# Altium schematic symbol library LimeMicroAltiumLib.SchLib: 588 symbols (part 6 of 13)
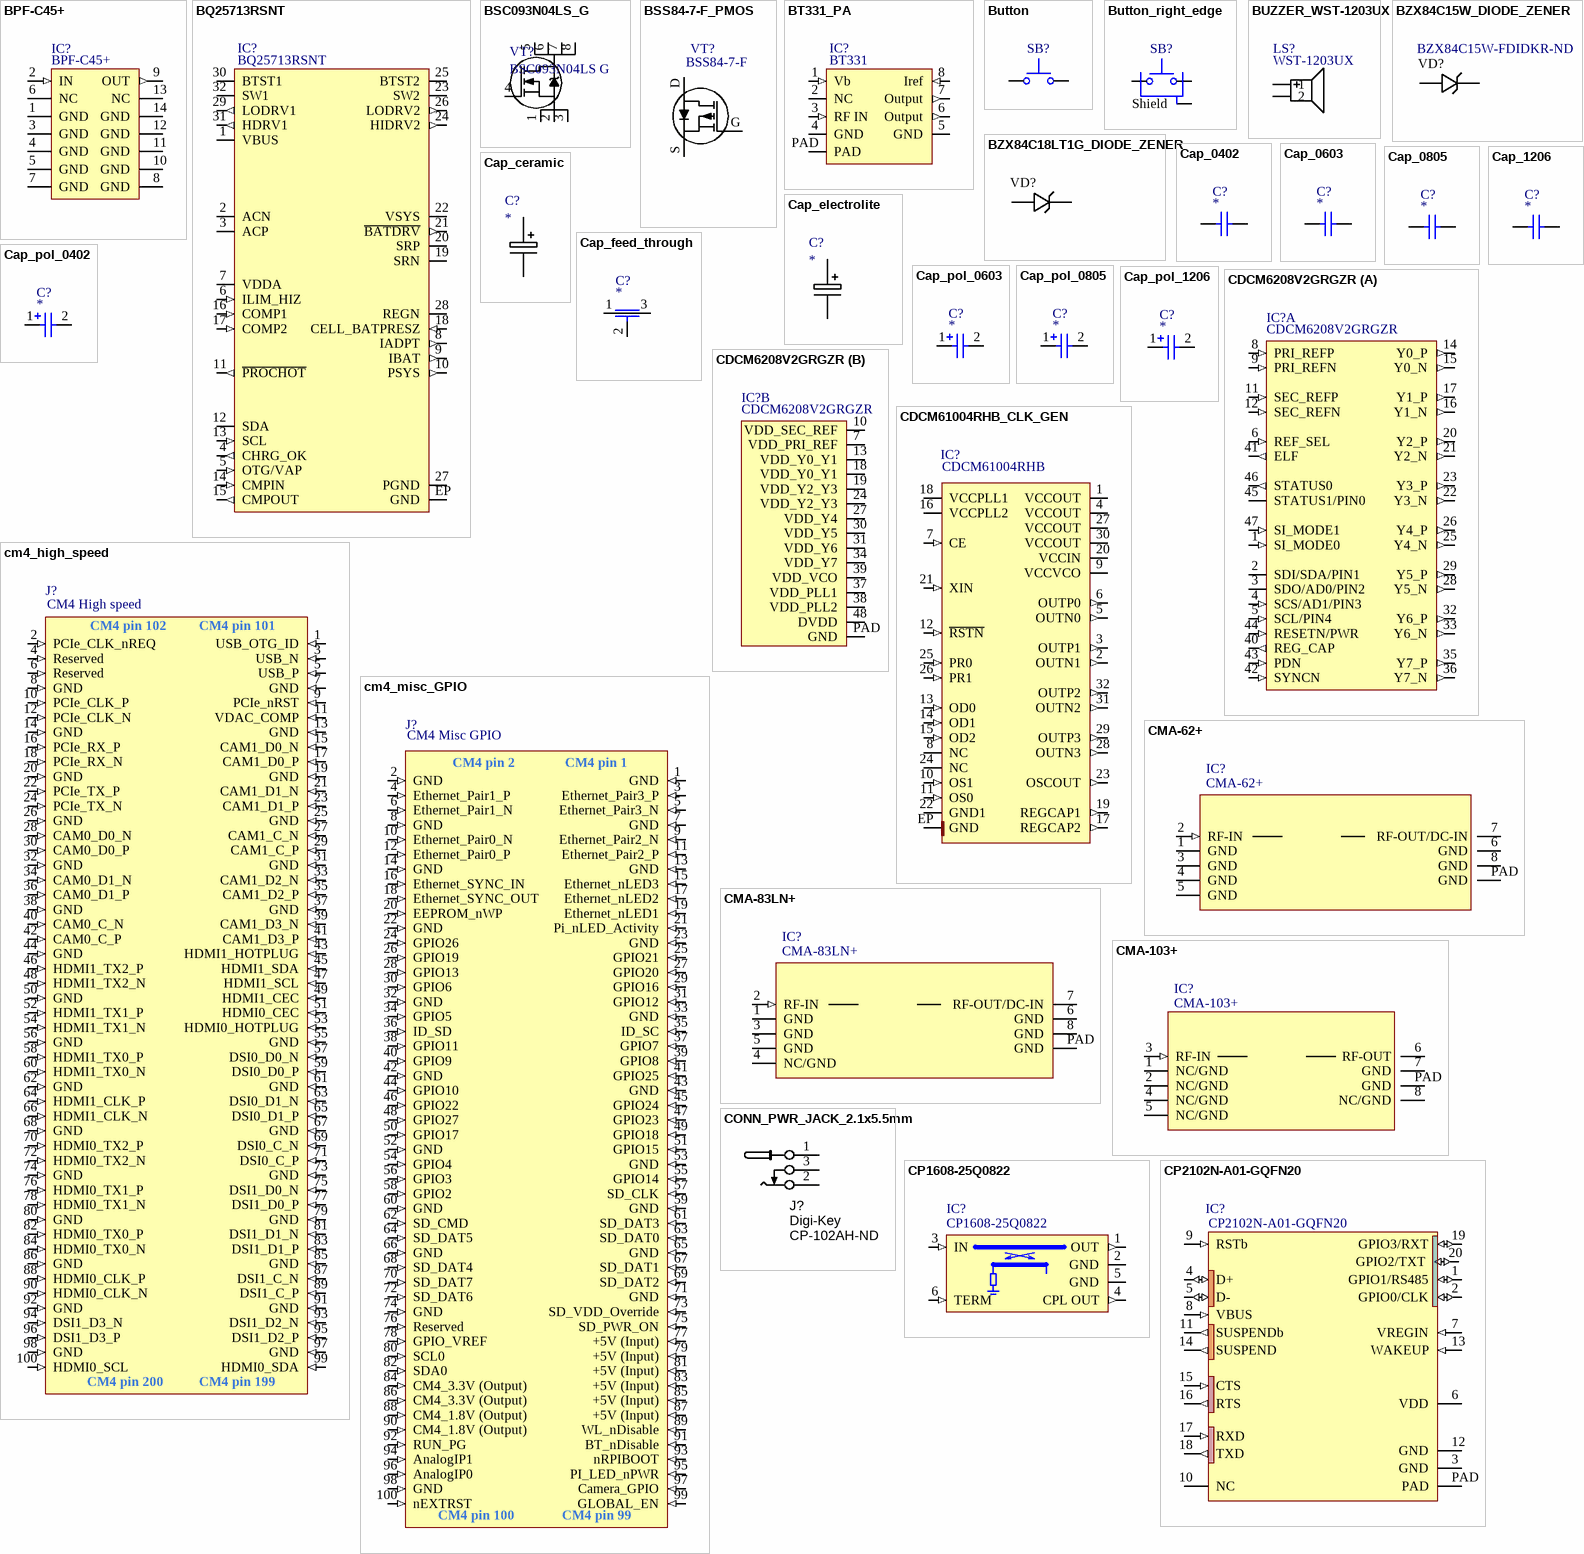
[diagram p79: symbols BPF-C45+ to CP2102N-A01-GQFN20]

## cm4_high_speed
designator J?, comment CM4 High speed
Manufacturer: Hirose; Manufacturer Part Number 1: DF40HC(3.0)-100DS-0.4V(51; Part Description: 100 Position Connector Receptacle, Center Strip Contacts Surface Mount Gold; Supplier 1: Mouser; Supplier Part Number 1: 798-DF40HC30100DS451; Stock 1: 0; Pricing 1: 1=2,50000, 10=2,15000, 50=2,15000, 100=2,00000, 250=1,75000, 500=1,70000, 1000=1,45000, 3000=1,34000, 10000=1,34000 (USD); RoHS: Yes; ComponentLink1URL: https://datasheet.ciiva.com/13559/ed-df40-20140305-13559540.pdf?src-supplier=Mouser; ComponentLink1Description: https://datasheet.ciiva.com/13559/ed-df40-20140305-13559540.pdf?src-supplier=Mouser; ComponentLink2URL: https://datasheet.ciiva.com/18562/ed-df40-20140305-18562462.pdf?src-supplier=Digi-Key; ComponentLink2Description: https://datasheet.ciiva.com/18562/ed-df40-20140305-18562462.pdf?src-supplier=Digi-Key
footprint FP-DF40HC_3_0_-100DS-0_4V-MFG
pins: 1 USB_OTG_ID (in), 2 PCIe_CLK_nREQ (in), 3 USB_N (in), 4 Reserved (in), 5 USB_P (in), 6 Reserved (in), 7 GND (in), 8 GND (in), 9 PCIe_nRST (in), 10 PCIe_CLK_P (in), 11 VDAC_COMP (in), 12 PCIe_CLK_N (in), 13 GND (in), 14 GND (in), 15 CAM1_D0_N (in), 16 PCIe_RX_P (in), 17 CAM1_D0_P (in), 18 PCIe_RX_N (in), 19 GND (in), 20 GND (in), 21 CAM1_D1_N (in), 22 PCIe_TX_P (in), 23 CAM1_D1_P (in), 24 PCIe_TX_N (in), 25 GND (in), 26 GND (in), 27 CAM1_C_N (in), 28 CAM0_D0_N (in), 29 CAM1_C_P (in), 30 CAM0_D0_P (in), 31 GND (in), 32 GND (in), 33 CAM1_D2_N (in), 34 CAM0_D1_N (in), 35 CAM1_D2_P (in), 36 CAM0_D1_P (in), 37 GND (in), 38 GND (in), 39 CAM1_D3_N (in), 40 CAM0_C_N (in), 41 CAM1_D3_P (in), 42 CAM0_C_P (in), 43 HDMI1_HOTPLUG (in), 44 GND (in), 45 HDMI1_SDA (in), 46 HDMI1_TX2_P (in), 47 HDMI1_SCL (in), 48 HDMI1_TX2_N (in), 49 HDMI1_CEC (in), 50 GND (in), 51 HDMI0_CEC (in), 52 HDMI1_TX1_P (in), 53 HDMI0_HOTPLUG (in), 54 HDMI1_TX1_N (in), 55 GND (in), 56 GND (in), 57 DSI0_D0_N (in), 58 HDMI1_TX0_P (in), 59 DSI0_D0_P (in), 60 HDMI1_TX0_N (in), 61 GND (in), 62 GND (in), 63 DSI0_D1_N (in), 64 HDMI1_CLK_P (in), 65 DSI0_D1_P (in), 66 HDMI1_CLK_N (in), 67 GND (in), 68 GND (in), 69 DSI0_C_N (in), 70 HDMI0_TX2_P (in), 71 DSI0_C_P (in), 72 HDMI0_TX2_N (in), 73 GND (in), 74 GND (in), 75 DSI1_D0_N (in), 76 HDMI0_TX1_P (in), 77 DSI1_D0_P (in), 78 HDMI0_TX1_N (in), 79 GND (in), 80 GND (in), 81 DSI1_D1_N (in), 82 HDMI0_TX0_P (in), 83 DSI1_D1_P (in), 84 HDMI0_TX0_N (in), 85 GND (in), 86 GND (in), 87 DSI1_C_N (in), 88 HDMI0_CLK_P (in), 89 DSI1_C_P (in), 90 HDMI0_CLK_N (in), 91 GND (in), 92 GND (in), 93 DSI1_D2_N (in), 94 DSI1_D3_N (in), 95 DSI1_D2_P (in), 96 DSI1_D3_P (in), 97 GND (in), 98 GND (in), 99 HDMI0_SDA (in), 100 HDMI0_SCL (in)
text: CM4 pin 102; CM4 pin 101; CM4 pin 200; CM4 pin 199

## cm4_misc_GPIO
designator J?, comment CM4 Misc GPIO
Manufacturer: Hirose; Manufacturer Part Number 1: DF40HC(3.0)-100DS-0.4V(51; Part Description: 100 Position Connector Receptacle, Center Strip Contacts Surface Mount Gold; Supplier 1: Mouser; Supplier Part Number 1: 798-DF40HC30100DS451; Stock 1: 0; Pricing 1: 1=2,50000, 10=2,15000, 50=2,15000, 100=2,00000, 250=1,75000, 500=1,70000, 1000=1,45000, 3000=1,34000, 10000=1,34000 (USD); RoHS: Yes; ComponentLink1URL: https://datasheet.ciiva.com/13559/ed-df40-20140305-13559540.pdf?src-supplier=Mouser; ComponentLink1Description: https://datasheet.ciiva.com/13559/ed-df40-20140305-13559540.pdf?src-supplier=Mouser; ComponentLink2URL: https://datasheet.ciiva.com/18562/ed-df40-20140305-18562462.pdf?src-supplier=Digi-Key; ComponentLink2Description: https://datasheet.ciiva.com/18562/ed-df40-20140305-18562462.pdf?src-supplier=Digi-Key
footprint FP-DF40HC_3_0_-100DS-0_4V-MFG
pins: 1 GND (in), 2 GND (in), 3 Ethernet_Pair3_P (in), 4 Ethernet_Pair1_P (in), 5 Ethernet_Pair3_N (in), 6 Ethernet_Pair1_N (in), 7 GND (in), 8 GND (in), 9 Ethernet_Pair2_N (in), 10 Ethernet_Pair0_N (in), 11 Ethernet_Pair2_P (in), 12 Ethernet_Pair0_P (in), 13 GND (in), 14 GND (in), 15 Ethernet_nLED3 (in), 16 Ethernet_SYNC_IN (in), 17 Ethernet_nLED2 (in), 18 Ethernet_SYNC_OUT (in), 19 Ethernet_nLED1 (in), 20 EEPROM_nWP (in), 21 Pi_nLED_Activity (in), 22 GND (in), 23 GND (in), 24 GPIO26 (in), 25 GPIO21 (in), 26 GPIO19 (in), 27 GPIO20 (in), 28 GPIO13 (in), 29 GPIO16 (in), 30 GPIO6 (in), 31 GPIO12 (in), 32 GND (in), 33 GND (in), 34 GPIO5 (in), 35 ID_SC (in), 36 ID_SD (in), 37 GPIO7 (in), 38 GPIO11 (in), 39 GPIO8 (in), 40 GPIO9 (in), 41 GPIO25 (in), 42 GND (in), 43 GND (in), 44 GPIO10 (in), 45 GPIO24 (in), 46 GPIO22 (in), 47 GPIO23 (in), 48 GPIO27 (in), 49 GPIO18 (in), 50 GPIO17 (in), 51 GPIO15 (in), 52 GND (in), 53 GND (in), 54 GPIO4 (in), 55 GPIO14 (in), 56 GPIO3 (in), 57 SD_CLK (in), 58 GPIO2 (in), 59 GND (in), 60 GND (in), 61 SD_DAT3 (in), 62 SD_CMD (in), 63 SD_DAT0 (in), 64 SD_DAT5 (in), 65 GND (in), 66 GND (in), 67 SD_DAT1 (in), 68 SD_DAT4 (in), 69 SD_DAT2 (in), 70 SD_DAT7 (in), 71 GND (in), 72 SD_DAT6 (in), 73 SD_VDD_Override (in), 74 GND (in), 75 SD_PWR_ON (in), 76 Reserved (in), 77 +5V (Input) (in), 78 GPIO_VREF (in), 79 +5V (Input) (in), 80 SCL0 (in), 81 +5V (Input) (in), 82 SDA0 (in), 83 +5V (Input) (in), 84 CM4_3.3V (Output) (in), 85 +5V (Input) (in), 86 CM4_3.3V (Output) (in), 87 +5V (Input) (in), 88 CM4_1.8V (Output) (in), 89 WL_nDisable (in), 90 CM4_1.8V (Output) (in), 91 BT_nDisable (in), 92 RUN_PG (in), 93 nRPIBOOT (in), 94 AnalogIP1 (in), 95 PI_LED_nPWR (in), 96 AnalogIP0 (in), 97 Camera_GPIO (in), 98 GND (in), 99 GLOBAL_EN (in), 100 nEXTRST (in)
text: CM4 pin 2; CM4 pin 1; CM4 pin 100; CM4 pin 99

## CMA-62+
designator IC?
Monolithic Amplifier 50Ω 0.01 to 6 GHz; Manufacturer: Mini-Circuits; Part Description: Monolithic Amplifier 50Ω 0.01 to 6 GHz; Manufacturer Part Number 1: CMA-62+; Supplier 1: Mini-Circuits; Supplier Part Number 1: CMA-62+
footprint CMA-62+_DL1721 (Quad Flat No Lead, Plastic; 16 Terminals; Body 3 x 3 mm; Pitch 0.5 mm)
pins: 1 GND, 2 RF-IN (in), 3 GND, 4 GND, 5 GND, 6 GND, 7 RF-OUT/DC-IN (oc), 8 GND, PAD GND

## CMA-83LN+
designator IC?
Monolithic Amplifier 50Ω 0.5 to 8 GHz; Manufacturer: Mini-Circuits; Part Description: Monolithic Amplifier 50Ω 0.5 to 8 GHz; Manufacturer Part Number 1: CMA-83LN+; Supplier 1: Mini-Circuits; Supplier Part Number 1: CMA-83LN+
footprint CMA-62+_DL1721 (Quad Flat No Lead, Plastic; 16 Terminals; Body 3 x 3 mm; Pitch 0.5 mm)
pins: 1 GND, 2 RF-IN (in), 3 GND, 4 NC/GND, 5 GND, 6 GND, 7 RF-OUT/DC-IN (oc), 8 GND, PAD GND

## CMA-103+
designator IC?
Monolithic Amplifier 50Ω 0.05 to 4 GHz; Manufacturer: Mini-Circuits; Manufacturer Part Number 1: CMA-103+; Part Description: Monolithic Amplifier 50Ω 0.05 to 4 GHz; Supplier 1: Mini-Circuits; Supplier Part Number 1: CMA-103+
footprint CMA-103+_DL1721 (Quad Flat No Lead, Plastic; 16 Terminals; Body 3 x 3 mm; Pitch 0.5 mm)
pins: 1 NC/GND, 2 NC/GND, 3 RF-IN (in), 4 NC/GND, 5 NC/GND, 6 RF-OUT (oc), 7 GND, 8 NC/GND, PAD GND

## CONN_PWR_JACK_2.1x5.5mm
designator J?  Supplier 1: Digi-Key  Supplier Part Number 1: CP-102AH-ND  (hidden comment: *)
Power Connector, THT, 2.1mm ID, 5.5mm OD; Manufacturer 1: CUI Inc; Manufacturer Part Number 1: PJ-102AH; Category: Connectors; Mounting Type: Through Hole; Package / Case: PCB mount; Value: 2.1mm ID, 5.5mm OD
footprint CONN_PWR_JACK_2.1x5.5mm (Power Connector, 2.1mm ID, 5.5mm OD)
pins: 1, 2, 3

## CP1608-25Q0822
designator IC?
RF coupler; Part Description: 0.8 ~ 6 GHz monolithic coupler, 1608 package; Manufacturer: ACX; Supplier 1: ACX; Manufacturer Part Number 1: CP1608-25Q0822; Supplier Part Number 1: CP1608-25Q0822
footprint CP1608-25Q0822T
pins: 1 OUT (out), 2 GND, 3 IN (in), 4 CPL OUT (out), 5 GND, 6 TERM (in)

## CP2102N-A01-GQFN20
designator IC?
Part Description: USB Bridge, USB to UART USB 2.0 UART Interface 24-QFN (4x4); Manufacturer: Silicon Labs; Protocol: USB; Function: Bridge, USB to UART; Interface: UART; Standards: USB 2.0; Voltage - Supply: 2.2 V ~ 3.6 V; Current - Supply: 9.5mA; Supplier 1: Digi-Key; Manufacturer Part Number 1: CP2102N-A01-GQFN20; RoHS: RoHS Compliant; Category: Integrated Circuits (ICs); Stock 1: 19; Pricing 1: 1=1.34, 25=1.2928, 100=1.2423, 1000=1.1716 (USD); Packaging: Tray; Part Status: Active; Operating Temperature: -40°C ~ 85°C; Package / Case: 20-WFQFN Exposed Pad; Supplier Device Package: 20-QFN (3x3); ComponentLink1URL: http://www.silabs.com/support%20documents/technicaldocs/cp2102n-datasheet.pdf; ComponentLink1Description: http://www.silabs.com/support%20documents/technicaldocs/cp2102n-datasheet.pdf; Supplier Part Number 1: 336-3692-ND
footprint CP2102N-A01-GQFN20 (Footprint not found)
pins: 1 GPIO1/RS485 (io), 2 GPIO0/CLK (io), 3 GND, 4 D+ (io), 5 D- (io), 6 VDD (power), 7 VREGIN (in), 8 VBUS (in), 9 RSTb (in), 10 NC, 11 SUSPENDb (out), 12 GND, 13 WAKEUP (in), 14 SUSPEND (out), 15 CTS (in), 16 RTS (out), 17 RXD (in), 18 TXD (out), 19 GPIO3/RXT (io), 20 GPIO2/TXT (io), PAD

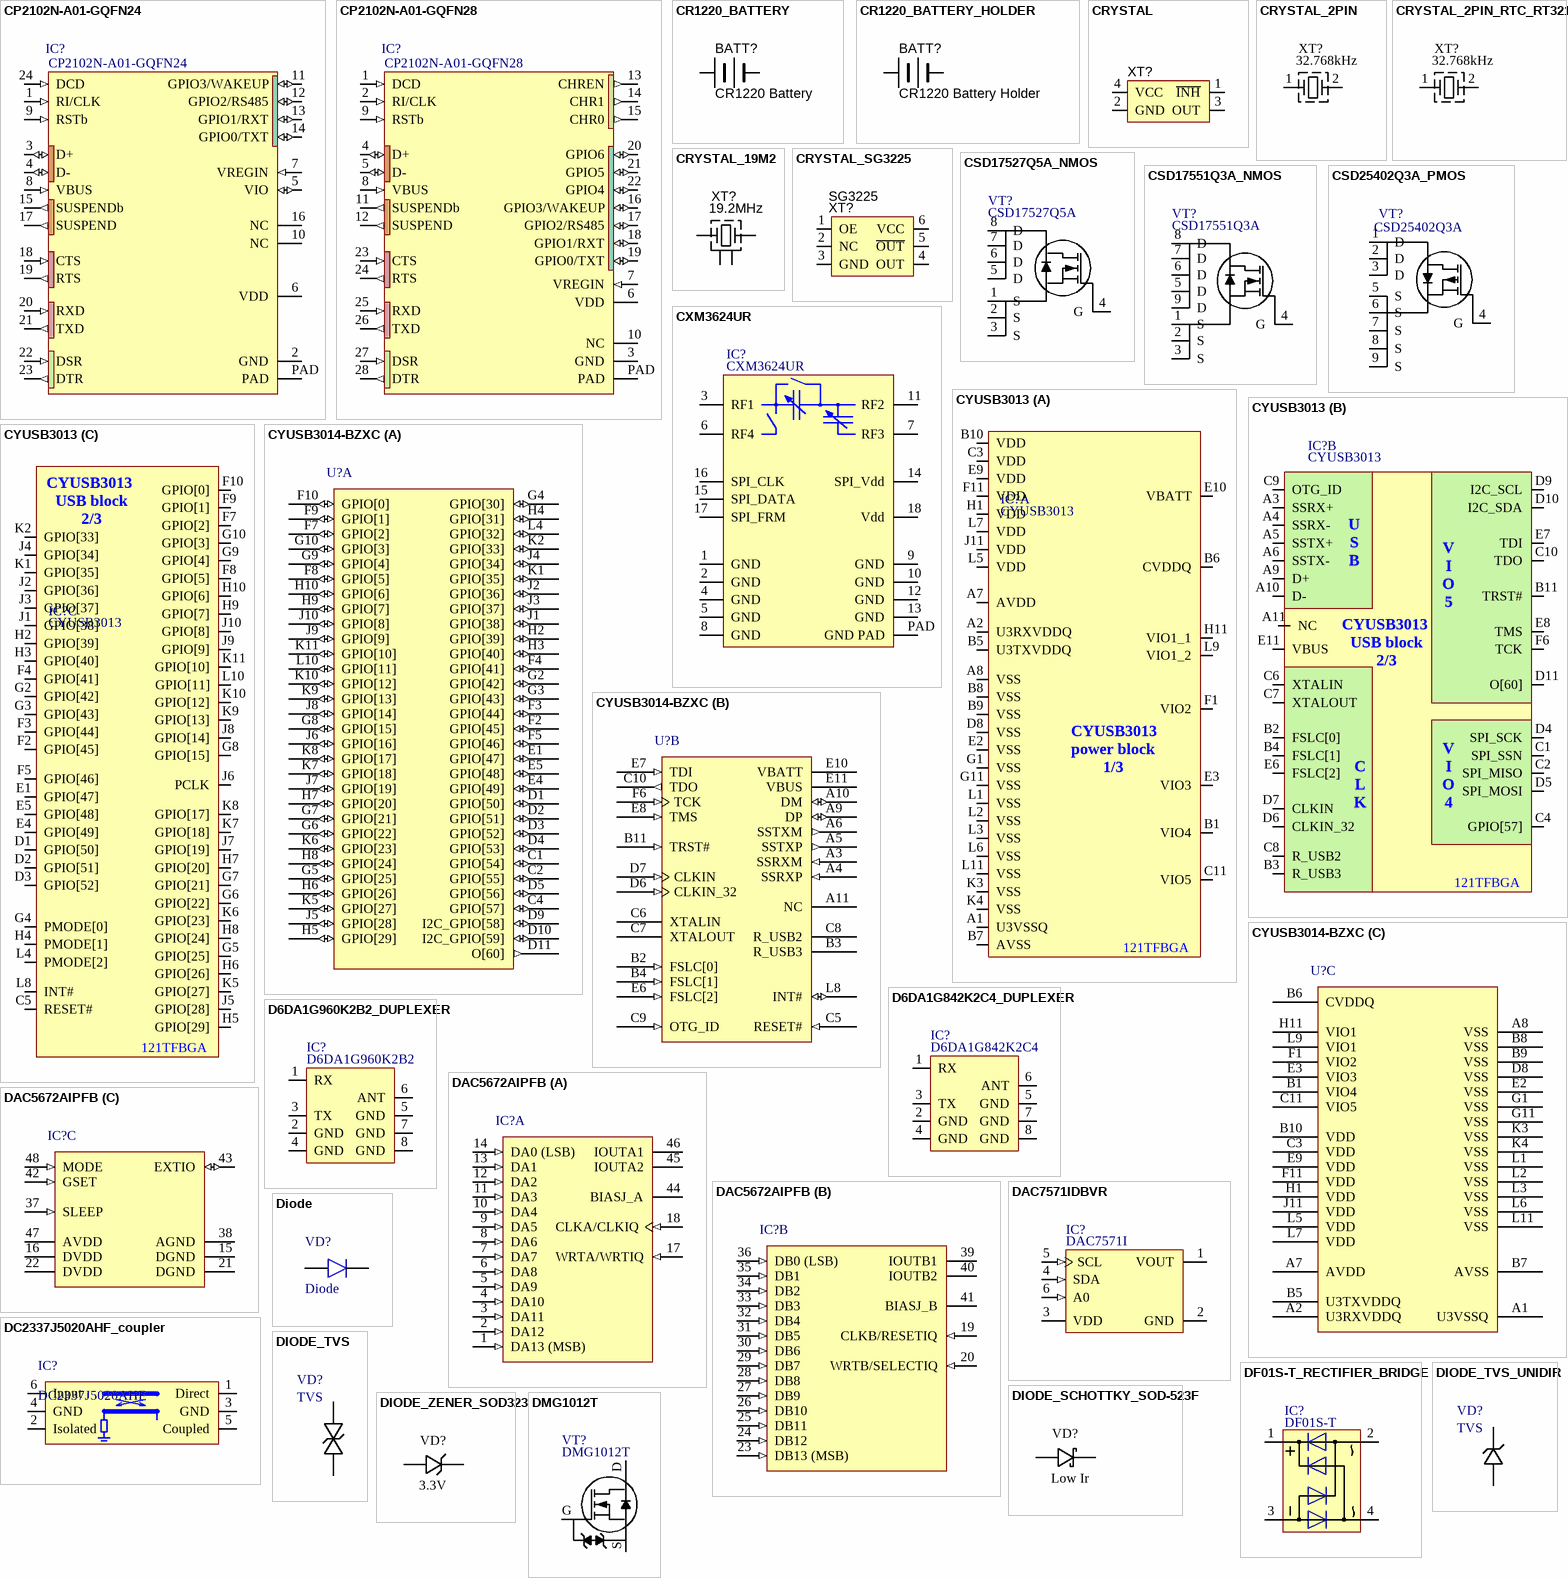
[diagram p25: symbols CP2102N-A01-GQFN24 to DMG1012T]

## CP2102N-A01-GQFN24
designator IC?
Part Description: USB Bridge, USB to UART USB 2.0 UART Interface 24-QFN (4x4); Manufacturer: Silicon Labs; Protocol: USB; Function: Bridge, USB to UART; Interface: UART; Standards: USB 2.0; Voltage - Supply: 2.2 V ~ 3.6 V; Current - Supply: 9.5mA; Supplier 1: Digi-Key; Manufacturer Part Number: CP2102N-A01-GQFN24; RoHS: RoHS Compliant; Category: Integrated Circuits (ICs); Stock 1: 608; Pricing 1: 1=1.36, 25=1.3132, 100=1.2625, 1000=1.2019 (USD); Packaging: Tray; Part Status: Active; Operating Temperature: -40°C ~ 85°C; Package / Case: 24-VFQFN Exposed Pad; Supplier Device Package: 24-QFN (4x4); ComponentLink1URL: http://www.silabs.com/support%20documents/technicaldocs/cp2102n-datasheet.pdf; ComponentLink1Description: http://www.silabs.com/support%20documents/technicaldocs/cp2102n-datasheet.pdf; Supplier Part Number 1: 336-3693-ND
footprint CP2102N-A01-GQFN24 (Footprint not found)
pins: 1 RI/CLK (in), 2 GND, 3 D+ (io), 4 D- (io), 5 VIO (io), 6 VDD (power), 7 VREGIN (in), 8 VBUS (in), 9 RSTb (in), 10 NC, 11 GPIO3/WAKEUP (io), 12 GPIO2/RS485 (io), 13 GPIO1/RXT (io), 14 GPIO0/TXT (io), 15 SUSPENDb (out), 16 NC, 17 SUSPEND (out), 18 CTS (in), 19 RTS (out), 20 RXD (in), 21 TXD (out), 22 DSR (in), 23 DTR (out), 24 DCD (in), PAD

## CP2102N-A01-GQFN28
designator IC?
Manufacturer: Silicon Labs; Part Description: USB Bridge, USB to UART USB 2.0 UART Interface 28-QFN (5x5); Protocol: USB; Function: Bridge, USB to UART; Interface: UART; Standards: USB 2.0; Voltage - Supply: 2.2 V ~ 3.6 V; Current - Supply: 9.5mA; Supplier 1: Digi-Key; Manufacturer Part Number 1: CP2102N-A01-GQFN28; RoHS: RoHS Compliant; Category: Integrated Circuits (ICs); Stock 1: 262; Pricing 1: 1=1.41, 25=1.3636, 100=1.313, 1000=1.2524 (USD); Packaging: Tray; Part Status: Active; Operating Temperature: -40°C ~ 85°C; Package / Case: 28-WFQFN Exposed Pad; Supplier Device Package: 28-QFN (5x5); ComponentLink1URL: http://www.silabs.com/support%20documents/technicaldocs/cp2102n-datasheet.pdf; ComponentLink1Description: http://www.silabs.com/support%20documents/technicaldocs/cp2102n-datasheet.pdf; Supplier Part Number 1: 336-3694-ND
footprint CP2102N-A01-GQFN28 (Footprint not found)
pins: 1 DCD (in), 2 RI/CLK (in), 3 GND, 4 D+ (io), 5 D- (io), 6 VDD (power), 7 VREGIN (in), 8 VBUS (in), 9 RSTb (in), 10 NC, 11 SUSPENDb (out), 12 SUSPEND (out), 13 CHREN (out), 14 CHR1 (out), 15 CHR0 (out), 16 GPIO3/WAKEUP (io), 17 GPIO2/RS485 (io), 18 GPIO1/RXT (io), 19 GPIO0/TXT (io), 20 GPIO6 (io), 21 GPIO5 (io), 22 GPIO4 (io), 23 CTS (in), 24 RTS (out), 25 RXD (in), 26 TXD (out), 27 DSR (in), 28 DTR (out), PAD

## CR1220_BATTERY
designator BATT?, comment CR1220 Battery  (mechanical)
Part Description: Lithium Battery Non-Rechargeable (Primary) 3V Coin, 12.5mm; Manufacturer: Panasonic - BSG; Battery Chemistry: Lithium; Battery Cell Size: Coin, 12.5mm; Voltage - Rated: 3V; Capacity: 35mAh; Discharge Rate: 100µA; Shipping Info: Due to possible restrictions, a change in ship method may be required.; Max Air Shipment Qty: 1600; Supplier 1: Digi-Key; Manufacturer Part Number 1: CR1220; RoHS: Not Applicable; Category: Battery Products; Stock 1: 19831; Pricing 1: 1=0.9, 10=0.812, 50=0.7214, 100=0.6312, 250=0.57712, 500=0.54106, 1600=0.48153, 3200=0.44651, 5000=0.43775 (USD); Part Status: Active; Size / Dimension: 0.49" Dia x 0.08" H (12.5mm x 2.0mm); Termination Style: Requires Holder; Weight: 1.2g; ComponentLink1URL: http://na.industrial.panasonic.com/sites/default/pidsa/files/crseries_datasheets_merged.pdf; ComponentLink1Description: http://na.industrial.panasonic.com/sites/default/pidsa/files/crseries_datasheets_merged.pdf; Supplier Part Number 1: P033-ND
pins: NEGATIVE, POSITIVE

## CR1220_BATTERY_HOLDER
designator BATT?, comment CR1220 Battery Holder
Part Description: HOLDER COIN CELL FOR CR1220 SMD; Manufacturer: MPD (Memory Protection Devices); Manufacturer Part Number 1: BC501SM; Battery Type, Function: Coin Cell, Holder; Style: Holder (Open); Battery Cell Size: Coin, 12.0mm; Number of Cells: 1; Battery Series: 1220; Supplier 1: Digi-Key; RoHS: RoHS Compliant; Category: Battery Products; Stock 1: 17830; Pricing 1: 1=0.88, 10=0.81, 100=0.73, 500=0.68, 1000=0.59 (USD); Part Status: Active; Mounting Type: PCB, Surface Mount; Termination Style: SMD (SMT) Tab; Height Above Board: 0.157" (4.00mm); Operating Temperature: -40°C ~ 85°C; ComponentLink1URL: http://www.memoryprotectiondevices.com/datasheets/BC501SM-datasheet.pdf; ComponentLink1Description: http://www.memoryprotectiondevices.com/datasheets/BC501SM-datasheet.pdf; Supplier Part Number 1: BC501SM-ND
footprint CR1220_SMD_holder
pins: NEGATIVE, POSITIVE

## CRYSTAL
designator XT?
Oscillator Crystal
footprint CRYSTAL_4-LCC_v3 (SMD Crystal 4-lead leadless package)
pins: 1 ~{INH}, 2 GND, 3 OUT, 4 VCC

## CRYSTAL_2PIN
designator XT?, comment 32.768kHz
Manufacturer 1: EPSON; Manufacturer Part Number 1: FC-135R 32.7680KA-A3; Part Description: 32.768kHz ±20ppm Crystal 12.5pF 50 kOhms 2-SMD, No Lead; Supplier 1: Digi-Key; Supplier Part Number 1: SER4071CT-ND
footprint CRYSTAL_RTC_2PIN_3P2x1P5
pins: 1 X, 2 X

## CRYSTAL_2PIN_RTC_RT3215
designator XT?, comment 32.768kHz
Part Description: 32.768 kHz ±10ppm Crystal 12.5pF 70 kOhms 2-SMD, No Lead; Manufacturer: Raltron Electronics; Manufacturer Part Number 1: RT3215-32.768-12.5-TR-10PPM; Supplier 1: Digi-Key; Supplier Part Number 1: 2151-RT3215-32.768-12.5-TR-10PPMTR-ND; Stock 1: 21000; Pricing 1: 3000=0,39875, 6000=0,38500, 15000=0,37125 (USD); Lead Free: Lead Free; RoHS Compliant: Yes; ComponentLink1URL: https://datasheet.octopart.com/RT3215-32.768-12.5-TR-10PPM-Raltron-Electronics-datasheet-12522443.pdf?src-supplier=Future+Electronics; ComponentLink1Description: https://datasheet.octopart.com/RT3215-32.768-12.5-TR-10PPM-Raltron-Electronics-datasheet-12522443.pdf?src-supplier=Future+Electronics; ComponentLink2URL: https://datasheet.octopart.com/RT3215-32.768-12.5-TR-10PPM-Raltron-Electronics-datasheet-62112304.pdf?src-supplier=Future+Electronics; ComponentLink2Description: https://datasheet.octopart.com/RT3215-32.768-12.5-TR-10PPM-Raltron-Electronics-datasheet-62112304.pdf?src-supplier=Future+Electronics; ComponentLink3URL: https://datasheet.octopart.com/RT3215-32.768-12.5-TR-10PPM-Raltron-Electronics-datasheet-82614827.pdf?src-supplier=Future+Electronics; ComponentLink3Description: https://datasheet.octopart.com/RT3215-32.768-12.5-TR-10PPM-Raltron-Electronics-datasheet-82614827.pdf?src-supplier=Future+Electronics
footprint CRYSTAL_2PIN_RTC_RT3215
pins: 1 X, 2 X

## CRYSTAL_19M2
designator XT?, comment 19.2MHz
Oscillator Crystal 27.12 MHz 10ppm; Manufacturer 1: TXC CORPORATION; Manufacturer Part Number 1: 7M-27.120MEEQ-T; Ratings: 4.9152 MHz Crystal; Load Capacitance: 10pF; Operating Mode: Fundamental; Package / Case: 2.5mm pitch; Material: Ceramic; Supplier 1: Digi-Key; Supplier Part Number 1: 887-1329-1-ND; Type: MHz Crystal; Frequency Stability: ±10ppm; Frequency Tolerance: ±10ppm; Operating Temperature: -20°C ~ 70°C; Mounting Type: Surface Mount; Size / Dimension: 0.126" L x 0.098" W (3.20mm x 2.50mm); ComponentLink1URL: http://www.txccrystal.com/images/pdf/7m-accuracy.pdf; ComponentLink1Description: http://www.txccrystal.com/images/pdf/7m-accuracy.pdf
footprint CRYSTAL_4-LCC (SMD Crystal 4-lead leadless package)
pins: 1 X, 2 GND, 3 X, 4 GND

## CRYSTAL_SG3225
designator XT?, comment SG3225
Oscillator Crystal; Manufacturer Part Number 1: SG3225EAN 100.000000M-KEGA3; Manufacturer: EPSON; Voltage - Supply: 2.5 V ~ 3.3 V; Output: LVPECL; Function: Tri-State (Output Enable); Frequency Stability: ±30ppm; Frequency: 100MHz; Current - Supply (Max): 65mA; Current - Supply (Disable) (Max): 20mA; Supplier 1: Digi-Key; Category: Crystals and Oscillators; Packaging: Cut Tape (CT); Type: XO (Standard); RoHS: RoHS Compliant; Package / Case: 6-SMD, No Lead (DFN, LCC); Height: 0.047" (1.20mm); Mounting Type: Surface Mount; Ratings: -; Operating Temperature: -40°C ~ 85°C; Size / Dimension: 0.126" L x 0.098" W (3.20mm x 2.50mm); Supplier Part Number 1: SER3921CT-ND
footprint CRYSTAL_6-LCC (SMD Crystal 6-lead leadless package)
pins: 1 OE, 2 NC, 3 GND, 4 OUT, 5 ~{OUT}, 6 VCC (power)

## CSD17527Q5A_NMOS
designator VT?, comment CSD17527Q5A
Part Desription: N-Channel 30V 65A (Tc) 3W (Ta) Surface Mount 8-VSONP (5x6); Manufacturer: Texas Instruments; Rise Time: 8.2ns; Rds On Max: 10.8mR; Input Capacitance: 506pF; Drain to Source Voltage (Vdss): 30V; Continuous Drain Current (ID): 65A; Max Power Dissipation: 3W; Fall Time: 3.2ns; Gate to Source Voltage (Vgs): 20V; Turn-Off Delay Time: 9.8ns; Turn-On Delay Time: 5.6ns; Number of Elements: 1; Element Configuration: Single; ComponentLink1URL: http://www.st.com/web/en/resource/technical/document/datasheet/CD00103832.pdf; ComponentLink1Description: http://www.st.com/web/en/resource/technical/document/datasheet/CD00103832.pdf; ComponentLink2URL: http://www.st.com/content/ccc/resource/technical/document/datasheet/00/75/48/c3/62/90/4a/32/CD00103832.pdf/files/CD00103832.pdf/jcr:content/translations/en.CD00103832.pdf; ComponentLink2Description: http://www.st.com/content/ccc/resource/technical/document/datasheet/00/75/48/c3/62/90/4a/32/CD00103832.pdf/files/CD00103832.pdf/jcr:content/translations/en.CD00103832.pdf; ComponentLink3URL: http://www.mouser.com/ds/2/389/CD00103832-114014.pdf; ComponentLink3Description: http://www.mouser.com/ds/2/389/CD00103832-114014.pdf; Supplier 1: Digi-Key; Manufacturer Part Number 1: CSD17527Q5A; RoHS: Yes; Stock 1: 28951; Pricing 1: 1 = 1,20000, 10 = 1,06600, 100 = 0,84280, 500 = 0,65364, 1000 = 0,51603 (USD); Mount: Surface Mount; Number of Pins: 8; Contact Plating: Tin; Min Operating Temperature: -55°C; Max Operating Temperature: 150°C; Packaging: Tape and Reel; Package Quantity: 2500; Drain to Source Breakdown Voltage: 30V; Drain to Source Resistance: 10.8mR; Power Dissipation: 3W; Radiation Hardening: No; ComponentLink4URL: http://www.ti.com/general/docs/lit/getliterature.tsp?genericPartNumber=CSD17527Q5A&&fileType=pdf; ComponentLink4Description: http://www.ti.com/general/docs/lit/getliterature.tsp?genericPartNumber=CSD17527Q5A&&fileType=pdf; ComponentLink5URL: http://www.ti.com/lit/ds/slps331a/slps331a.pdf; ComponentLink5Description: http://www.ti.com/lit/ds/slps331a/slps331a.pdf; ComponentLink6URL: http://www.ti.com/lit/ds/symlink/csd17527q5a.pdf; ComponentLink6Description: http://www.ti.com/lit/ds/symlink/csd17527q5a.pdf; ComponentLink7URL: http://www.ti.com/litv/slps331a; ComponentLink7Description: http://www.ti.com/litv/slps331a; Supplier Part Number 1: 296-29021-1-ND
footprint CSD17527Q5A_NMOS_8-VSONP
pins: 1 S, 2 S, 3 S, 4 G, 5 D, 6 D, 7 D, 8 D

## CSD17551Q3A_NMOS
designator VT?, comment CSD17551Q3A
Part Desription: N-Channel 12A (Tc) 2.6W (Ta) Surface Mount 8-SON (3.3x3.3); Manufacturer: Texas Instruments; Rds On Max: 9mR; Input Capacitance: 1.37nF; Rise Time: 24ns; Nominal Vgs: 1.6V; Drain to Source Voltage (Vdss): 30V; Continuous Drain Current (ID): 12A; Max Power Dissipation: 2.6W; Fall Time: 3.4ns; Drain to Source Resistance: 9.6mR; Turn-Off Delay Time: 12ns; Turn-On Delay Time: 8ns; Number of Elements: 1; Gate to Source Voltage (Vgs): 20V; ComponentLink1URL: http://www.st.com/web/en/resource/technical/document/datasheet/CD00103832.pdf; ComponentLink1Description: http://www.st.com/web/en/resource/technical/document/datasheet/CD00103832.pdf; ComponentLink2URL: http://www.st.com/content/ccc/resource/technical/document/datasheet/00/75/48/c3/62/90/4a/32/CD00103832.pdf/files/CD00103832.pdf/jcr:content/translations/en.CD00103832.pdf; ComponentLink2Description: http://www.st.com/content/ccc/resource/technical/document/datasheet/00/75/48/c3/62/90/4a/32/CD00103832.pdf/files/CD00103832.pdf/jcr:content/translations/en.CD00103832.pdf; ComponentLink3URL: http://www.mouser.com/ds/2/389/CD00103832-114014.pdf; ComponentLink3Description: http://www.mouser.com/ds/2/389/CD00103832-114014.pdf; ComponentLink4URL: http://www.ti.com/general/docs/lit/getliterature.tsp?genericPartNumber=CSD17527Q5A&&fileType=pdf; ComponentLink4Description: http://www.ti.com/general/docs/lit/getliterature.tsp?genericPartNumber=CSD17527Q5A&&fileType=pdf; ComponentLink5URL: http://www.ti.com/lit/ds/slps331a/slps331a.pdf; ComponentLink5Description: http://www.ti.com/lit/ds/slps331a/slps331a.pdf; ComponentLink6URL: http://www.ti.com/lit/ds/symlink/csd17527q5a.pdf; ComponentLink6Description: http://www.ti.com/lit/ds/symlink/csd17527q5a.pdf; ComponentLink7URL: http://www.ti.com/litv/slps331a; ComponentLink7Description: http://www.ti.com/litv/slps331a; Supplier 1: Digi-Key; Supplier Part Number 1: 296-35025-1-ND; Manufacturer Part Number 1: CSD17551Q3A; Stock 1: 7637; Pricing 1: 1=0,87000, 10=0,76900, 25=0,72240, 100=0,52430, 500=0,43804, 1000=0,37280 (USD); RoHS: Yes; Mount: Surface Mount; Number of Pins: 8; Contact Plating: Tin,Matte; Min Operating Temperature: -55°C; Max Operating Temperature: 150°C; Package Quantity: 1; Packaging: Tape and Reel; Power Dissipation: 2.6W; Threshold Voltage: 1.6V; Radiation Hardening: No; REACH SVHC: Unknown; Lead Free: Lead Free; ComponentLink8URL: https://datasheet.ciiva.com/6387/csd17551q3a-6387809.pdf?src-supplier=Digi-Key; ComponentLink8Description: https://datasheet.ciiva.com/6387/csd17551q3a-6387809.pdf?src-supplier=Digi-Key; ComponentLink9URL: https://datasheet.ciiva.com/13063/csd17551q3a-109222-13063418.pdf?src-supplier=Mouser; ComponentLink9Description: https://datasheet.ciiva.com/13063/csd17551q3a-109222-13063418.pdf?src-supplier=Mouser; ComponentLink10URL: https://datasheet.ciiva.com/14192/csd17551q3a-14192907.pdf?src-supplier=Avnet; ComponentLink10Description: https://datasheet.ciiva.com/14192/csd17551q3a-14192907.pdf?src-supplier=Avnet; ComponentLink11URL: https://datasheet.ciiva.com/22656/csd17551q3a-22656093.pdf?src-supplier=Farnell; ComponentLink11Description: https://datasheet.ciiva.com/22656/csd17551q3a-22656093.pdf?src-supplier=Farnell; ComponentLink12URL: https://datasheet.ciiva.com/6387/csd17551q3a-6387807.pdf?src-supplier=Digi-Key; ComponentLink12Description: https://datasheet.ciiva.com/6387/csd17551q3a-6387807.pdf?src-supplier=Digi-Key